# Altium footprint library 电阻封装库.PcbLib: 54 footprints (part 3 of 4)
Each footprint in its own frame and in the unit in brackets; x right, y up, seen from the top. Pads: shape width x height; smd on the part's side, far side on the other; paste and mask are expansions set on the pad; w line width, h text height; cw(c..) or ccw(c..) is an arc to the next point about the centre after c.
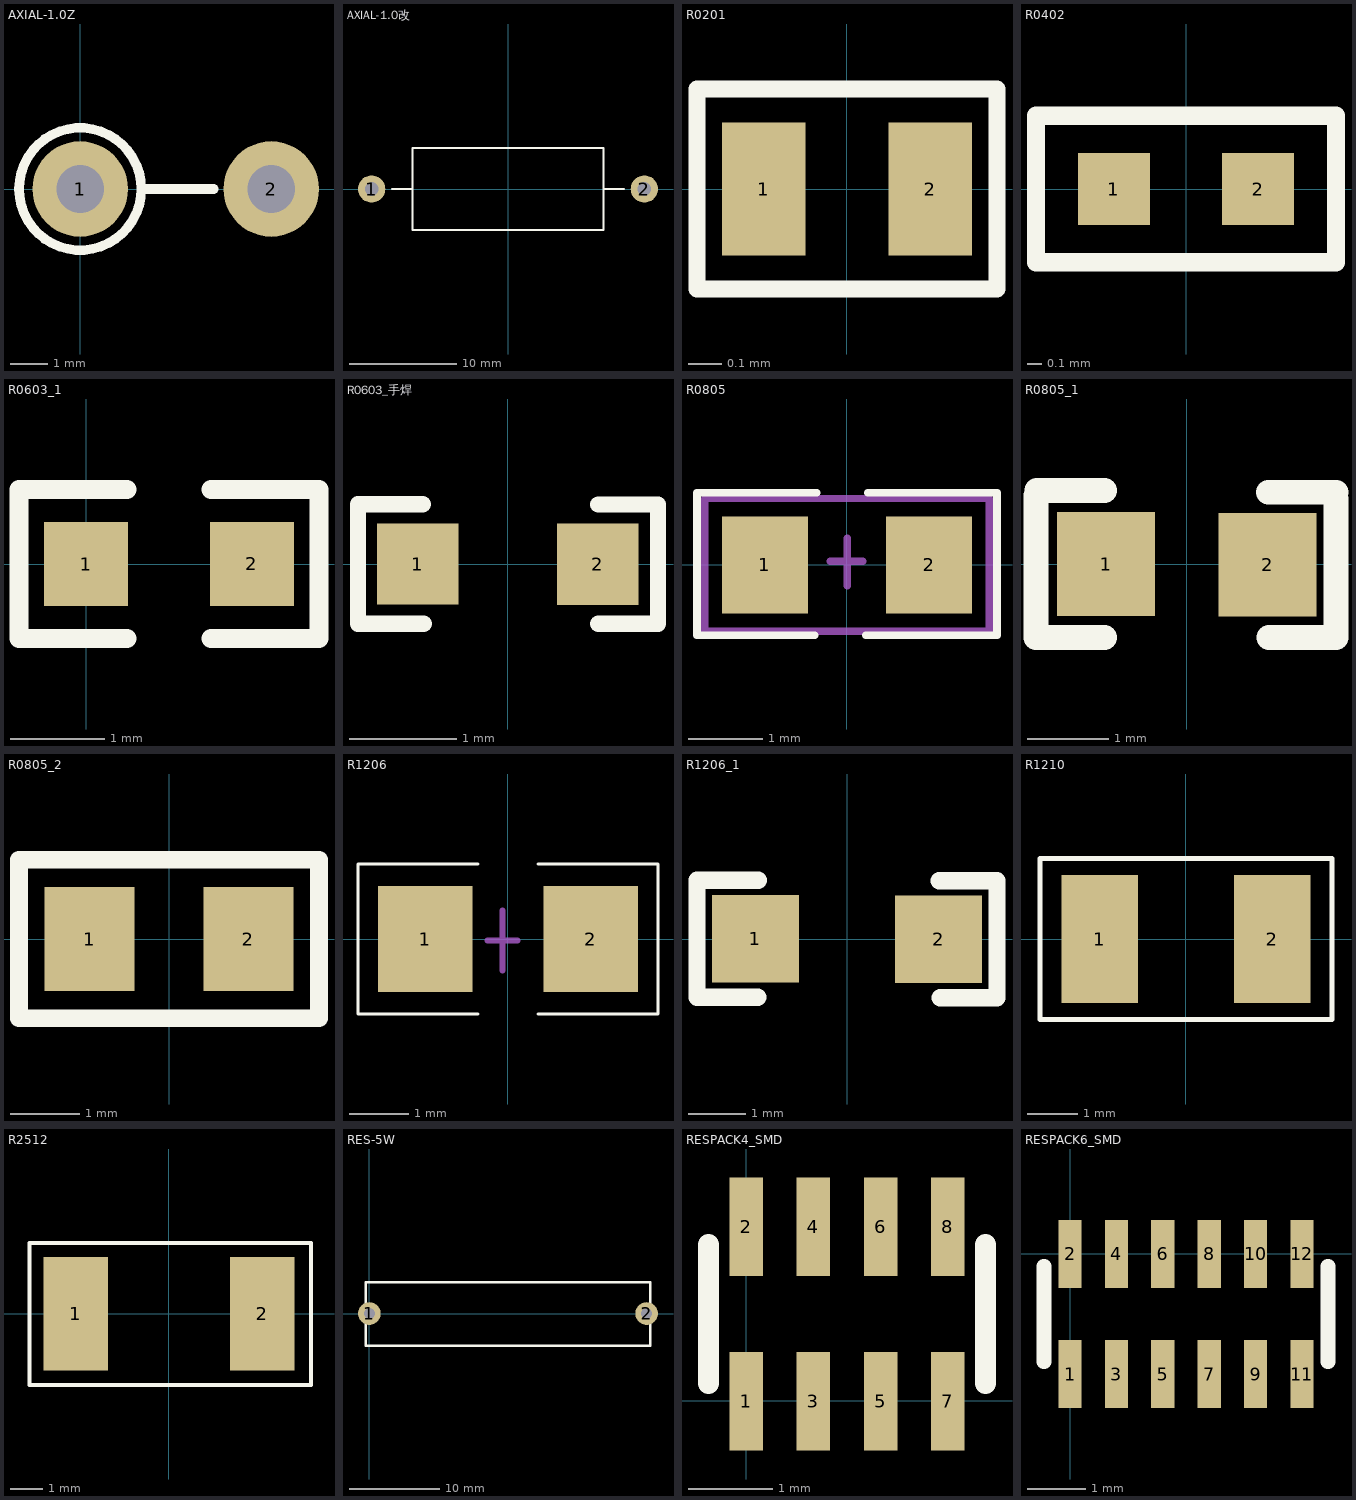
[diagram p2: the footprints below, top view; thin cyan lines are the x and y axes]

## AXIAL-1.0Z [mm]
pads (2):
  round 2.54 hole 1.27: 1(0,0) 2(5.08,0)
Top Overlay:
  circle w0.254: c0,0 r1.626
  lines w0.254: 1.626,0 3.556,0

## AXIAL-1.0改 [mm] "Axial Device, Thru-Hole; 2 Leads; 1.0 in Pin Spacing"
height 7.62
pads (2):
  round 2.54 hole 1.27: 1(-12.7,0) 2(12.7,0)
Top Overlay:
  lines w0.2: -10.795,0 -8.89,0 ; 8.89,0 10.795,0 ; -8.89,-3.81 8.89,-3.81 8.89,3.81 -8.89,3.81 -8.89,-3.81

## R0201 [mm]
height 0.3
pads (2):
  rect 0.25x0.4 smd: 1(-0.25,0) 2(0.25,0)
Top Overlay:
  lines w0.05: -0.45,-0.3 -0.45,0.3 0.45,0.3 0.45,-0.3 -0.45,-0.3
3D body: height 0.3, standoff -0.01, extent -0.305,-0.152 0.295,0.153

## R0402 [mm]
height 0.5
pads (2):
  rect 0.5x0.5 smd: 1(-0.5,0) 2(0.5,0)
Top Overlay:
  lines w0.127: 0.229,-0.508 1.041,-0.508 ; 1.041,-0.508 1.041,0.508 -1.041,0.508 -1.041,-0.508 1.041,-0.508
3D body: height 0.5, standoff -0.01, extent -0.483,-0.255 0.517,0.255

## R0603_1 [mil]
height 35.04
pads (2):
  rect 35x35 smd: 1(0,0) 2(69,0)
Top Overlay:
  lines w7.87: 17,-31 -28,-31 -28,31 17,31 ; 52,-31 97,-31 97,31 52,31
3D body: height 35.93, standoff 0.5, extent 3.01,-16 66,15.89

## R0603_手焊 [mil]
pads (2):
  rect 30x30 smd: 1(-33.16,0.03) 2(33.16,-0.03)
Top Overlay:
  lines w6: -31.35,22.08 -55.17,22.08 -55.17,-22.02 -30.96,-22.02 ; 33.21,-22.02 55.26,-22.02 55.26,21.92 33.21,21.92
3D body: height 17.72, standoff 0, extent -31.89,-15.35 31.1,16.14

## R0805 [mm]
height 0.5
pads (2):
  rect 1.15x1.3 smd: 1(-1.1,0) 2(1.1,0)
Top Overlay:
  lines w0.102: -0.432,-0.94 -2.007,-0.94 -2.007,0.965 -0.406,0.965 ; 0.254,-0.94 2.007,-0.94 2.007,0.965 0.279,0.965
Mechanical 15:
  lines w0.1: -0.222,0.051 0.006,0.051 ; 0.006,-0.279 0.006,0.356 ; 0.006,0.025 0.006,0.051 ; 0.21,0.051 0.006,0.051 ; -1.905,-0.889 1.905,-0.889 1.905,0.889 -1.905,0.889 -1.905,-0.889
3D body: height 0.5, standoff -0.01, extent -1,-0.61 1,0.6

## R0805_1 [mm]
pads (2):
  rect 1.2x1.27 smd: 1(-0.99,0.005) 2(0.99,-0.005)
Top Overlay:
  lines w0.305: -1.85,-0.895 -1.85,0.845 ; -1.84,0.905 -1.01,0.905 ; -1.82,-0.895 -1.01,-0.895 ; 1,0.885 1.83,0.885 ; 1.01,-0.895 1.83,-0.895 1.83,0.805
3D body: height 0.78, standoff 0, extent -1.02,-0.61 0.98,0.64

## R0805_2 [mm]
height 0.5
pads (2):
  rect 1.3x1.5 smd: 1(-1.143,0) 2(1.143,0)
Top Overlay:
  lines w0.254: -2.159,-1.143 2.159,-1.143 2.159,0.508 2.159,1.143 -2.159,1.143 -2.159,0.635 -2.159,-1.143
3D body: height 0.55, standoff 0, extent -1,-0.63 1,0.63

## R1206 [mm]
height 1
pads (2):
  rect 1.6x1.8 smd: 1(-1.4,0) 2(1.4,0)
Top Overlay:
  lines w0.051: -0.508,-1.27 -2.54,-1.27 -2.54,1.27 -0.508,1.27 ; 0.508,-1.27 2.54,-1.27 2.54,1.27 0.508,1.27
Mechanical 15:
  lines w0.1: -0.349,-0.025 0.159,-0.025 ; -0.095,-0.533 -0.095,0.483
3D body: height 1, standoff -0.01, extent -1.6,-0.813 1.6,0.797

## R1206_1 [mm]
height 1.99
pads (2):
  rect 1.524x1.524 smd: 1(-1.6,0.005) 2(1.6,-0.005)
Top Overlay:
  lines w0.305: -1.56,-1.015 -2.62,-1.015 -2.62,1.025 ; 1.61,1.015 2.62,1.015 2.62,-1.025 1.63,-1.025 ; -2.62,1.025 -1.55,1.025 -2.62,1.025
3D body: height 1, standoff 0, extent -1.602,-0.795 1.598,0.805

## R1210 [mm]
height 2.5
pads (2):
  rect 1.52x2.54 smd: 1(-1.71,0) 2(1.71,0)
Top Overlay:
  lines w0.1: -2.9,-1.6 2.9,-1.6 2.9,1.6 -2.9,1.6 -2.9,-1.6
3D body: height 0.98, standoff -0.03, extent -1.651,-1.305 1.549,1.245

## R2512 [mil]
height 25.59
pads (2):
  rect 80x140 smd: 1(-115,0) 2(115,0)
Top Overlay:
  lines w5: -172,-88 175,-88 175,87 -172,87 -172,-88
3D body: height 25.41, standoff -0.57, extent -124,-64 126,62.38

## RES-5W [mm]
pads (2):
  round 2.5 hole 1.2: 1(0,0) 2(30.582,0)
Top Overlay:
  lines w0.254: -0.406,-3.556 -0.406,3.454 30.988,3.454 30.988,-3.556 -0.406,-3.556
3D body: height 4.35, standoff -6.85, extent -0.349,-3.52 30.931,3.48

## RESPACK4_SMD [mm]
pads (8):
  rect 0.4x1.174 smd: 1(0,-0.001) 2(0,2.073) 3(0.8,-0.001) 4(0.8,2.073) 5(1.6,-0.001) 6(1.6,2.073) 7(2.4,-0.001) 8(2.4,2.073)
Top Overlay:
  lines w0.254: -0.45,0.211 -0.45,1.861 ; 2.85,0.211 2.85,1.861

## RESPACK6_SMD [mm]
pads (12):
  rect 0.4x1.174 smd: 1(0,-2.074) 2(0,0) 3(0.8,-2.074) 4(0.8,0) 5(1.6,-2.074) 6(1.6,0) 7(2.4,-2.074) 8(2.4,0) 9(3.2,-2.074) 10(3.2,0) 11(4,-2.074) 12(4,0)
Top Overlay:
  lines w0.254: -0.45,-1.862 -0.45,-0.212 ; 4.45,-1.862 4.45,-0.212